# Altium footprint library 9-Pcblib_Con.PcbLib: 266 footprints (part 1 of 17)
Each footprint in its own frame and in the unit in brackets; x right, y up, seen from the top. Pads: shape width x height; smd on the part's side, far side on the other; paste and mask are expansions set on the pad; w line width, h text height; cw(c..) or ccw(c..) is an arc to the next point about the centre after c.
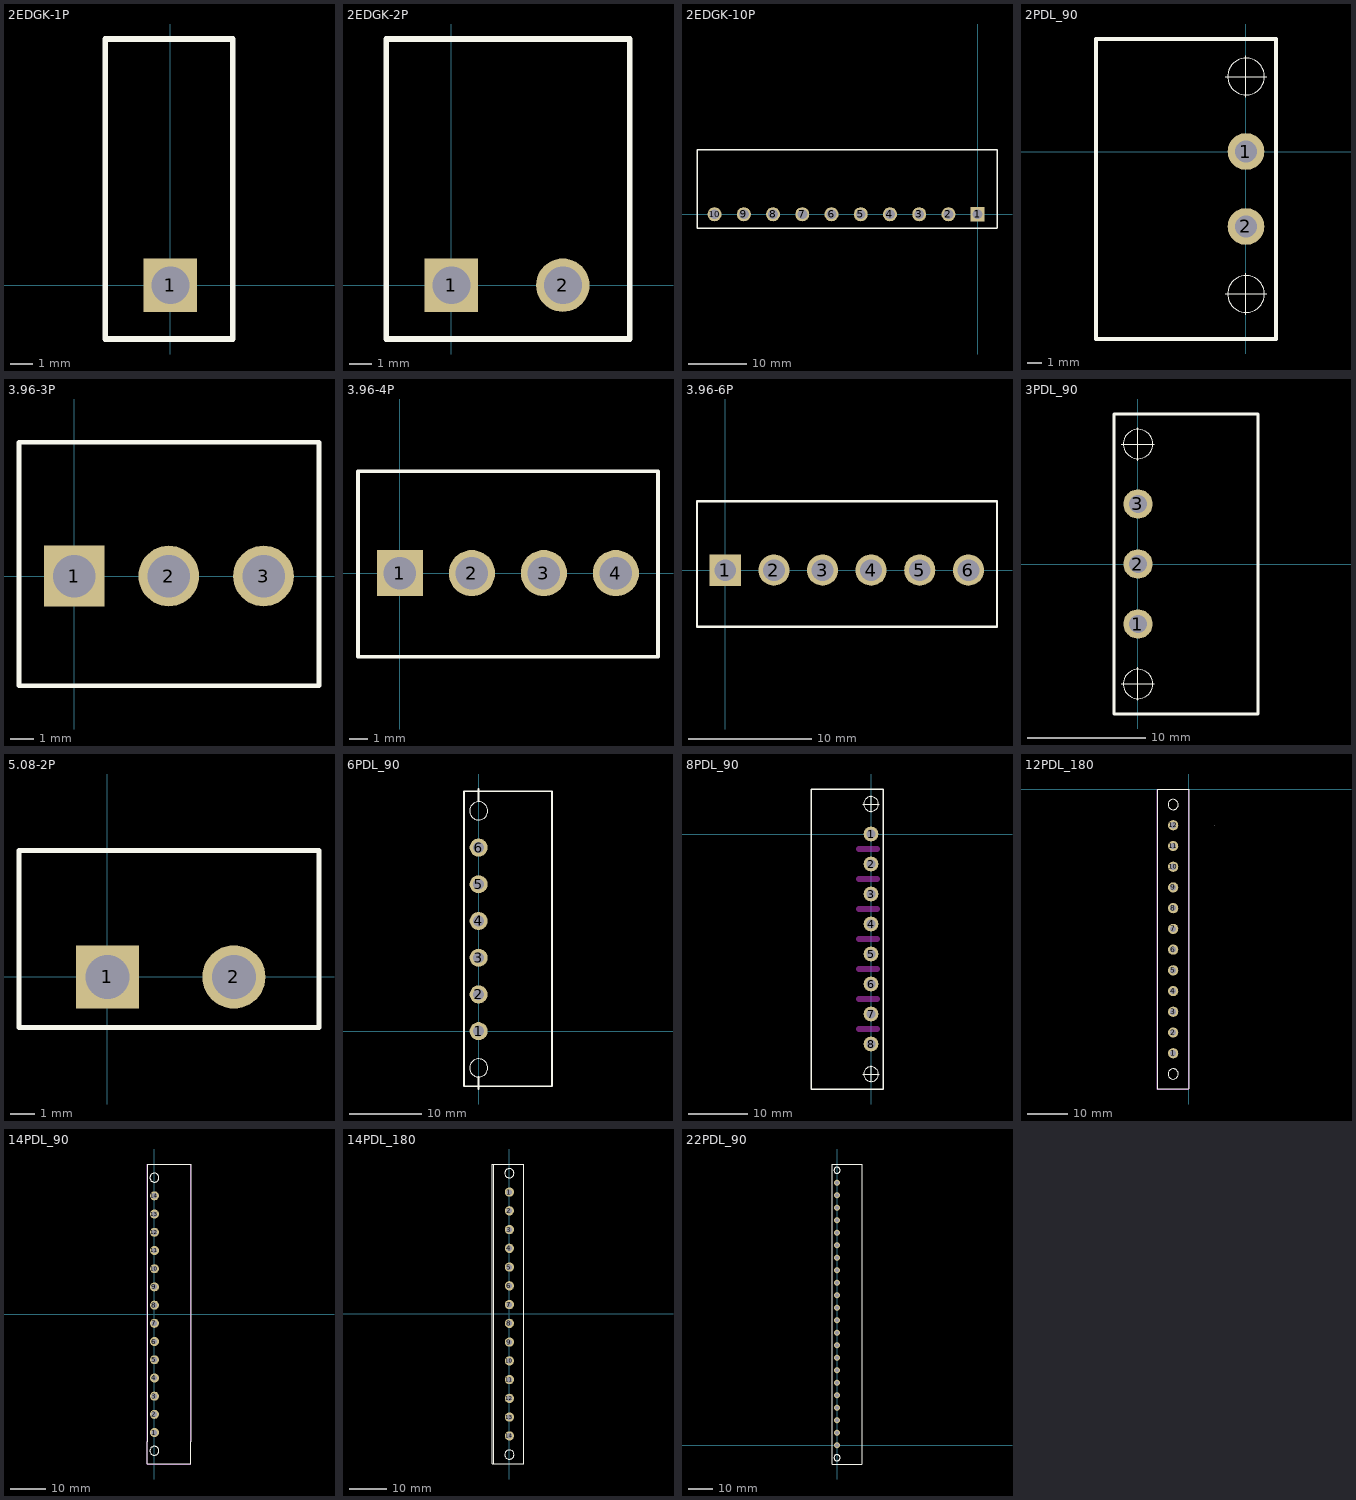
[diagram p0: the footprints below, top view; thin cyan lines are the x and y axes]

## 2EDGK-1P [mm]
pads (1):
  rect 2.4x2.4 hole 1.7: 1(0,0)
Top Overlay:
  lines w0.254: -2.921,-2.413 -2.921,11.049 2.794,11.049 2.794,-2.413 -2.921,-2.413
3D body: height 1.25, standoff -9.25, extent -2.54,-1.778 2.46,10.422

## 2EDGK-2P [mm]
pads (2):
  rect 2.4x2.4 hole 1.7: 1(0,0)
  round 2.4 hole 1.7: 2(5,0)
Top Overlay:
  lines w0.254: -2.921,-2.413 8.001,-2.413 8.001,11.049 -2.921,11.049 -2.921,-2.413
3D body: height 9.25, standoff -1.25, extent -2.46,-1.778 7.54,10.422

## 2EDGK-10P [mm]
pads (10):
  rect 2.4x2.4 hole 1.7: 1(0,0)
  round 2.4 hole 1.7: 2(-5,0) 3(-10,0) 4(-15,0) 5(-20,0) 6(-25,0) 7(-30,0) 8(-35,0) 9(-40,0) 10(-45,0)
Top Overlay:
  lines w0.254: -48.006,11.049 -48.006,-2.413 3.23,-2.413 ; -47.934,11.053 3.302,11.053 ; 3.302,-2.413 3.302,11.049
3D body: height 1.25, standoff -9.25, extent -47.479,-1.786 2.521,10.414

## 2PDL_90 [mil]
pads (2):
  round 98 hole 59: 1(0,0) 2(0,-200)
Top Overlay:
  circle w1: c0,200 r49
  circle w1: c0,-380 r49
  circle w1: c0,-380 r49
  lines w1: -175,300 -150,300 ; -55,200 55,200 ; 0,145 0,255 ; -55,-380 55,-380 -55,-380 ; 0,-435 0,-325 0,-435
  lines w10: -400,-500 -400,-100 -400,300 80,300 80,-100 80,-500 -400,-500

## 3.96-3P [mil]
pads (3):
  rect 100x100 hole 70: 1(0,0)
  round 100 hole 70: 2(155.91,0) 3(311.81,0)
Top Overlay:
  lines w7.87: -90.75,-180.71 403.07,-180.71 403.07,220.28 -90.75,220.28 -90.75,-180.71

## 3.96-4P [mil]
pads (4):
  rect 100x100 hole 70: 1(0,0)
  round 100 hole 70: 2(155.91,0) 3(311.81,0) 4(467.72,0)
Top Overlay:
  lines w7.87: -90.75,-180.71 -90.75,220.28 558.98,220.28 558.98,-180.71 -90.75,-180.71

## 3.96-6P [mil]
pads (6):
  rect 100x100 hole 70: 1(0,0)
  round 100 hole 70: 2(155.91,0) 3(311.81,0) 4(467.72,0) 5(623.62,0) 6(779.53,0)
Top Overlay:
  lines w7.87: -90.75,-180.71 -90.75,220.28 871.26,220.28 871.26,-180.71 -90.75,-180.71

## 3PDL_90 [mil] "紧固螺丝-3-"
pads (3):
  round 98 hole 59: 1(0,-200) 2(0,0) 3(0,200)
Top Overlay:
  circle w1: c0,400 r49
  circle w1: c0,-400 r49
  lines w1: -55,-400 55,-400 ; -55,400 55,400 ; 0,-455 0,-345 ; 0,345 0,455 ; 150,500 175,500
  lines w10: -80,-500 400,-500 400,500 -80,500 -80,-500
3D body: height 347.04, standoff -188.39, extent -73.31,-499 407,501

## 5.08-2P [mil] "插拔端子"
pads (2):
  rect 100x100 hole 70: 1(0,0)
  round 100 hole 70: 2(200,0)
Top Overlay:
  lines w7.87: -140,-80 -140,200 332.44,200 ; -137.8,-80 334.65,-80 334.65,200

## 6PDL_90 [mm]
pads (6):
  round 2.5 hole 1.5: 1(0,0) 2(0,5.08) 3(0,10.16) 4(0,15.24) 5(0,20.32) 6(0,25.4)
Top Overlay:
  circle w0.127: c0,-5.08 r1.25
  circle w0.127: c0,30.48 r1.25
  lines w0.254: 0,-8 0,-6.35 ; 0,31.8 0,33.5 ; -2.032,-7.62 -2.032,-2.54 -2.032,33.2 10.16,33.2 10.16,-2.54 10.16,-7.62 -2.032,-7.62
3D body: height 8.81, standoff -4.79, extent -1.854,-7.645 10.346,32.995

## 8PDL_90 [mil]
pads (8):
  round 98 hole 59: 1(0,0) 2(0,-200) 3(0,-400) 4(0,-600) 5(0,-800) 6(0,-1000) 7(0,-1200) 8(0,-1400)
Top Overlay:
  circle w1: c0,-1601.1 r49
  circle w1: c0,-1601.1 r49
  circle w1: c0,200 r49
  lines w1: -175,300 -150,300 ; -55,200 55,200 ; 0,145 0,255 ; -55,-1601.1 55,-1601.1 -55,-1601.1 ; 0,-1656.1 0,-1546.1 0,-1656.1
  lines w10: -400,-1700 80,-1700 80,-100 80,300 -400,300 -400,-100 -400,-1700
Keep-Out Layer:
  lines w40: -80,-1300 40,-1300 ; -80,-1100 40,-1100 ; -80,-900 40,-900 ; -80,-700 40,-700 ; -80,-500 40,-500 ; -80,-300 40,-300 ; -80,-100 40,-100
3D body: height 347.04, standoff -188.39, extent -410,-1695 70.31,305

## 12PDL_180 [mm]
height 1.2
pads (12):
  round 2.5 hole 1.5: 1(-3.869,-64.774) 2(-3.869,-59.694) 3(-3.869,-54.614) 4(-3.869,-49.534) 5(-3.869,-44.454) 6(-3.869,-39.374) 7(-3.869,-34.294) 8(-3.869,-29.214) 9(-3.869,-24.134) 10(-3.869,-19.054) 11(-3.869,-13.974) 12(-3.869,-8.894)
Top Overlay:
  circle w0.127: c-3.869,-3.814 r1.25
  circle w0.127: c-3.869,-69.854 r1.25
  lines w0.025: 6.289,-8.894 ccw(c6.289,-8.894) 6.29,-8.894
  lines w0.254: -7.739,-73.537 -7.74,0 0,0 0.001,-73.537 -5.902,-73.537 -7.739,-73.537
Mechanical 13:
  lines w0.1: -7.739,-73.543 0.001,-73.543 0.001,0 -7.739,0 -7.739,-73.543
3D body: height 12.5, standoff -7, extent -8.969,-72.394 -0.369,-1.274

## 12PDL_W [mm]
3D body: height 0, standoff -12.2, extent -36.779,-9.042 44.501,4.558

## 14PDL_90 [mm]
pads (14):
  round 2.5 hole 1.5: 1(0,-33.02) 2(0,-27.94) 3(0,-22.86) 4(0,-17.78) 5(0,-12.7) 6(0,-7.62) 7(0,-2.54) 8(0,2.54) 9(0,7.62) 10(0,12.7) 11(0,17.78) 12(0,22.86) 13(0,27.94) 14(0,33.02)
Top Overlay:
  circle w0.127: c0,-38.1 r1.25
  circle w0.127: c0,38.1 r1.25
  lines w0.254: -2.033,41.914 -2.032,-35.56 -2.033,-41.783 10.159,-41.783 10.16,-35.56 10.159,41.914 -2.033,41.914
Mechanical 13:
  lines w0.1: -1.997,-41.789 -1.997,41.914 10.159,41.914 10.159,-41.789 -1.997,-41.789
3D body: height 8.8, standoff -4.8, extent -2.011,-40.615 10.189,40.665

## 14PDL_180 [mm]
pads (14):
  round 2.5 hole 1.5: 1(0,33.02) 2(0,27.94) 3(0,22.86) 4(0,17.78) 5(0,12.7) 6(0,7.62) 7(0,2.54) 8(0,-2.54) 9(0,-7.62) 10(0,-12.7) 11(0,-17.78) 12(0,-22.86) 13(0,-27.94) 14(0,-33.02)
Top Overlay:
  circle w0.2: c0,38.1 r1.25
  circle w0.2: c0,-38.1 r1.25
  lines w0.1: -4.267,-40.64 -4.267,40.615 ; -4.623,-40.64 3.861,-40.64 3.861,-35.56 3.861,35.56 3.861,40.615 -4.597,40.615 -4.623,40.589 -4.623,-40.64
3D body: height 12.11, standoff -3.9, extent -4.665,-40.63 3.835,40.65

## 22PDL_90 [mm]
pads (22):
  round 2.5 hole 1.5: 1(0,0) 2(0,5.08) 3(0,10.16) 4(0,15.24) 5(0,20.32) 6(0,25.4) 7(0,30.48) 8(0,35.56) 9(0,40.64) 10(0,45.72) 11(0,50.8) 12(0,55.88) 13(0,60.96) 14(0,66.04) 15(0,71.12) 16(0,76.2) 17(0,81.28) 18(0,86.36) 19(0,91.44) 20(0,96.52) 21(0,101.6) 22(0,106.68)
Top Overlay:
  circle w0.127: c0,-5.08 r1.25
  circle w0.127: c0,111.76 r1.25
  lines w0.254: -2.032,-7.62 -2.032,-2.54 -2.032,114.3 10.16,114.3 10.16,-2.54 10.16,-7.62 -2.032,-7.62